# Altium footprint library altium_parts_templates_PCB.PcbLib: 93 footprints (part 1 of 6)
Each footprint in its own frame and in the unit in brackets; x right, y up, seen from the top. Pads: shape width x height; smd on the part's side, far side on the other; paste and mask are expansions set on the pad; w line width, h text height; cw(c..) or ccw(c..) is an arc to the next point about the centre after c.
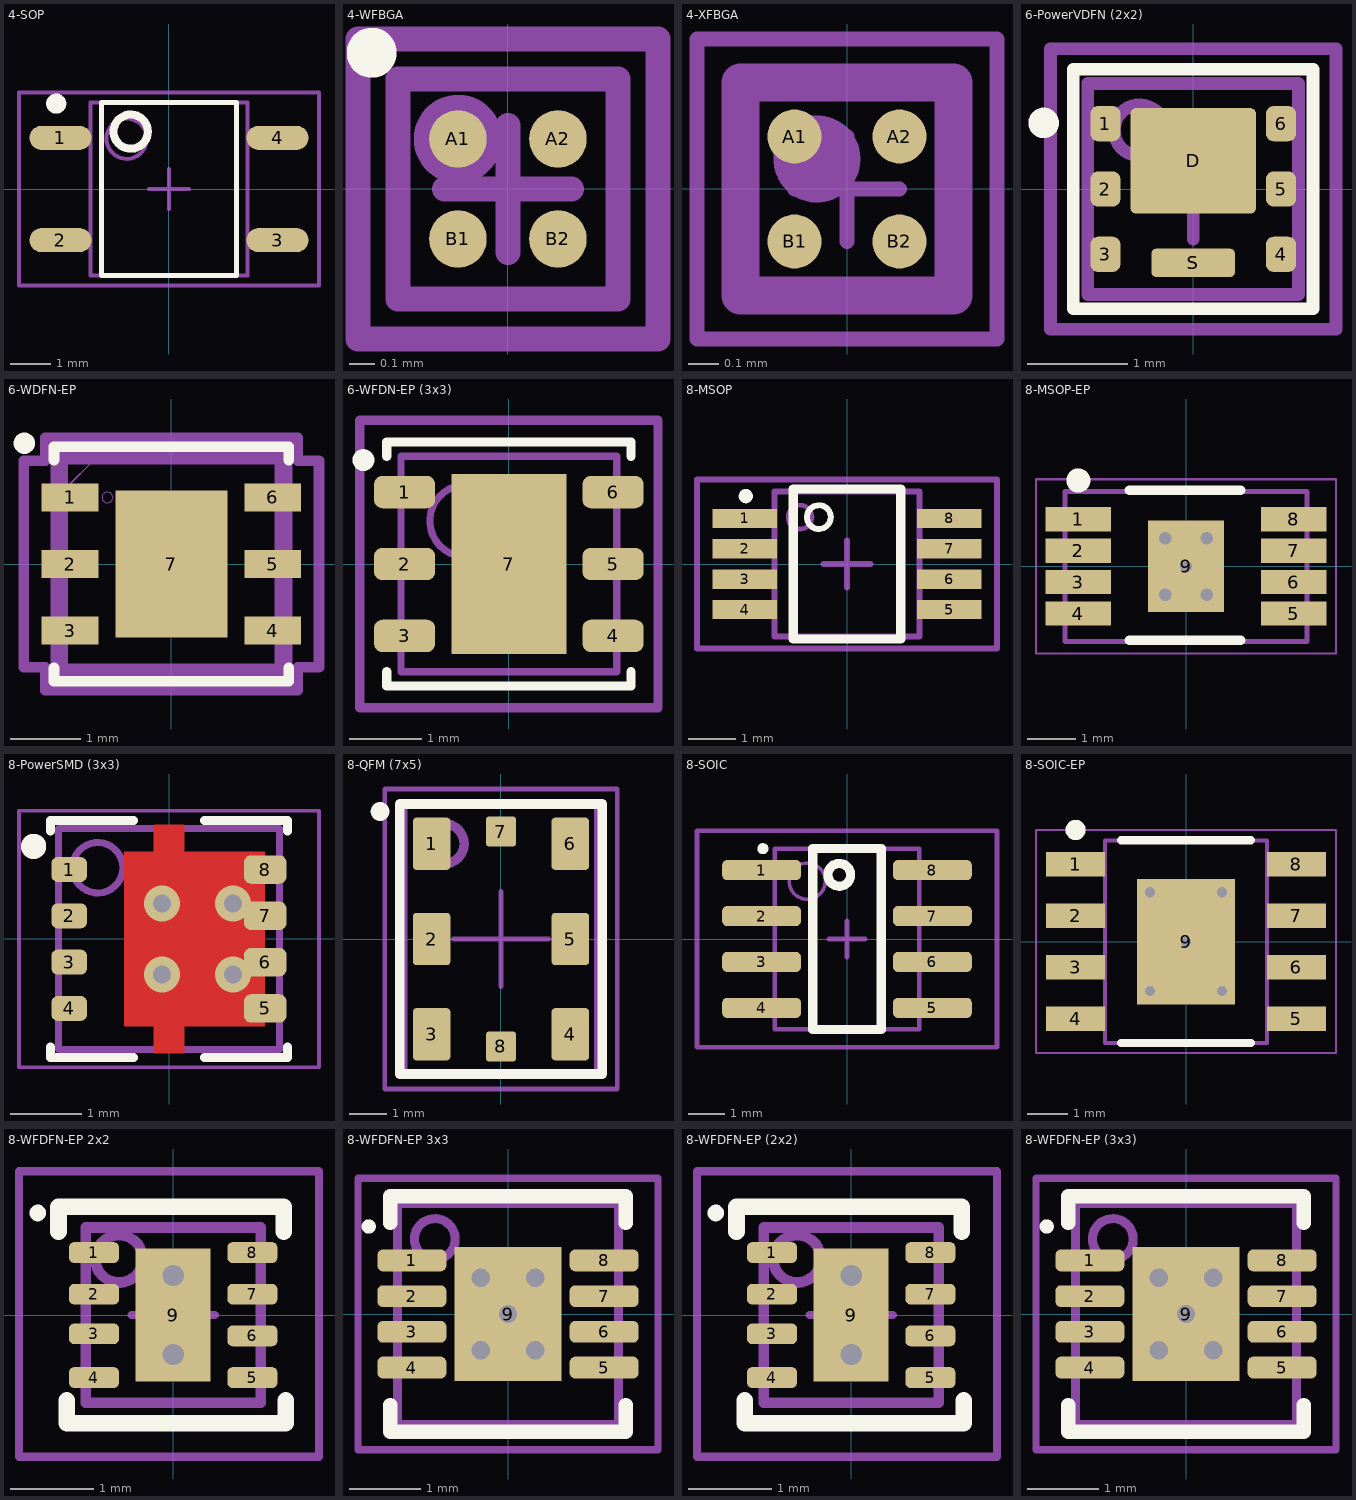
[diagram p0: the footprints below, top view; thin cyan lines are the x and y axes]

## 4-SOP [mm]
height 2.19
pads (4):
  oval 1.54x0.6 smd paste-0.025 mask+0.07: 1(-2.695,1.27) 2(-2.695,-1.27) 3(2.695,-1.27) 4(2.695,1.27)
Top Overlay:
  circle w0.25: c-2.8,2.12 r0.125
  circle w0.2: c-0.95,1.425 r0.425
  lines w0.127: -1.675,-2.15 -1.675,2.15 1.675,2.15 1.675,-2.15 -1.675,-2.15
Top Assembly Drawing:
  circle w0.1: c-1.05,1.25 r0.5
  lines w0.1: -1.95,-2.15 -1.95,2.15 1.95,2.15 1.95,-2.15 -1.95,-2.15
Top Courtyard:
  lines w0.1: -0.5,0 0.5,0 ; 0,-0.5 0,0.5 ; -3.725,-2.4 -3.725,2.4 3.725,2.4 3.725,-2.4 -3.725,-2.4
3D body "SOP254P610X218-4N.step": height 2.18, standoff 0, extent -3.049,-2.15 3.049,2.15

## 4-WFBGA [mm] "4-WFBGA, 4-DSBGA"
height 0.68
pads (4):
  round 0.23 smd paste+0 mask+0.04: A1(-0.2,0.2) A2(0.2,0.2) B1(-0.2,-0.2) B2(0.2,-0.2)
Top Overlay:
  circle w0.1: c-0.545,0.545 r0.05
Top Assembly Drawing:
  circle w0.254: c-0.2,0.2 r0.05
  lines w0.1: -0.44,-0.44 0.44,-0.44 0.44,0.44 -0.44,0.44 -0.44,-0.44
Top Courtyard:
  lines w0.1: -0.254,0 0.254,0 ; 0,-0.254 0,0.254 ; -0.6,-0.6 0.6,-0.6 0.6,0.6 -0.6,0.6 -0.6,-0.6
3D body "SEN_TEMP_LMT70YFQT.step": height 0.67, standoff 0, extent -0.44,-0.44 0.44,0.44

## 4-XFBGA [mm] "4-XFBGA, 4-DSBGA"
height 0.4
pads (4):
  round 0.18 smd paste-2 mask+0.038: A1(-0.175,0.175) A2(0.175,0.175) B1(-0.175,-0.175) B2(0.175,-0.175)
Top Paste:
  region: 0,-0.04
  region: -0.28,0.23 -0.28,0.24 -0.272,0.258 -0.258,0.272 -0.24,0.28 -0.23,0.28 -0.12,0.28 -0.11,0.28 -0.092,0.272 -0.078,0.258 -0.07,0.24 -0.07,0.23 -0.07,0.12 -0.07,0.11 -0.078,0.092 -0.092,0.078 -0.11,0.07 -0.12,0.07 -0.23,0.07 -0.24,0.07 -0.258,0.078 -0.272,0.092 -0.28,0.11 -0.28,0.12
  region: 0.07,0.23 0.07,0.24 0.078,0.258 0.092,0.272 0.11,0.28 0.12,0.28 0.23,0.28 0.24,0.28 0.258,0.272 0.272,0.258 0.28,0.24 0.28,0.23 0.28,0.12 0.28,0.11 0.272,0.092 0.258,0.078 0.24,0.07 0.23,0.07 0.12,0.07 0.11,0.07 0.092,0.078 0.078,0.092 0.07,0.11 0.07,0.12
  region: -0.28,-0.12 -0.28,-0.11 -0.272,-0.092 -0.258,-0.078 -0.24,-0.07 -0.23,-0.07 -0.12,-0.07 -0.11,-0.07 -0.092,-0.078 -0.078,-0.092 -0.07,-0.11 -0.07,-0.12 -0.07,-0.23 -0.07,-0.24 -0.078,-0.258 -0.092,-0.272 -0.11,-0.28 -0.12,-0.28 -0.23,-0.28 -0.24,-0.28 -0.258,-0.272 -0.272,-0.258 -0.28,-0.24 -0.28,-0.23
  region: 0.07,-0.12 0.07,-0.11 0.078,-0.092 0.092,-0.078 0.11,-0.07 0.12,-0.07 0.23,-0.07 0.24,-0.07 0.258,-0.078 0.272,-0.092 0.28,-0.11 0.28,-0.12 0.28,-0.23 0.28,-0.24 0.272,-0.258 0.258,-0.272 0.24,-0.28 0.23,-0.28 0.12,-0.28 0.11,-0.28 0.092,-0.272 0.078,-0.258 0.07,-0.24 0.07,-0.23
Top Assembly Drawing:
  circle w0.15: c-0.1,0.1 r0.07
  lines w0.127: -0.355,-0.355 -0.355,0.355 0.355,0.355 0.355,-0.355 -0.355,-0.355
Top Courtyard:
  lines w0.05: -0.175,0 0.175,0 ; 0,-0.175 0,0.175 ; -0.5,-0.5 -0.5,0.5 0.5,0.5 0.5,-0.5 -0.5,-0.5
3D body "BGA4C35P2X2_71X71X40.step": height 0.37, standoff -0.03, extent -0.355,-0.355 0.355,0.355

## 6-PowerVDFN (2x2) [mm] "6-PowerVDFN, 6-PQFN (2x2)"
height 1
pads (8):
  rrect50% 0.3x0.35 smd paste-0.01 mask+0.02: 1(-0.875,0.65) 2(-0.875,0) 3(-0.875,-0.65) 4(0.875,-0.65) 5(0.875,0) 6(0.875,0.65)
  rrect10% 1.25x1.05 smd paste-2 mask+0.02: D(0,0.28)
  rrect30% 0.83x0.28 smd paste-0.01 mask+0.02: S(0,-0.735)
Top Overlay:
  circle w0.152: c-1.49,0.658 r0.076
  lines w0.127: -1.194,-1.194 1.194,-1.194 1.194,1.194 -1.194,1.194 -1.194,-1.194
Top Paste:
  rectangle: -0.615,-0.235 -0.125,0.795
  region: 0.615,0.795 0.125,0.795 0.125,-0.235 0.615,-0.235
Top Assembly Drawing:
  circle w0.127: c-0.533,0.584 r0.254
  lines w0.127: -1.05,-1.05 -1.05,1.05 1.05,1.05 1.05,-1.05 -1.05,-1.05
Top Courtyard:
  lines w0.127: -0.5,0 0.5,0 ; 0,-0.5 0,0.5 ; -1.422,-1.397 -1.422,1.397 1.422,1.397 1.422,-1.397 -1.422,-1.397
3D body "QFN65P200X200X100_HS-7N.step": height 1, standoff 0, extent -1.051,-1.05 1.051,1.05

## 6-WDFN-EP [mil] "6-WSON (3x3), 6-WDFN-EP"
pads (7):
  rect 32x16 smd paste+0 mask+0: 1(-57,37.4) 2(-57,0) 3(-57,-37.4) 4(57,-37.4) 5(57,0) 6(57,37.4)
  rect 62.99x82.68 smd paste-40.84 mask+0: 7(0,0)
Top Overlay:
  circle w6: c-82.68,67.91 r3
  lines w6: -66,-58.5 -66,-66 66,-66 66,-58.5 ; -66,58.5 -66,66 66,66 66,58.5
Top Paste:
  region: 31.5,41.34 -31.5,41.34 -31.5,-41.34 31.5,-41.34
Top Assembly Drawing:
  lines w10: -62.99,-61.02 62.01,-61.02 62.99,-60.04 62.99,61.02 -62.99,61.02 -62.99,-61.02
Top 3D Model:
  circle w0: c-36,37.4 r3
  lines w1: -61,41 -41,61 ; -61,-61 -61,61 61,61 61,-61 -61,-61
Top Courtyard:
  lines w3.94: -9.84,0 9.84,0 ; 0,-9.84 0,9.84
  lines w6: -83,-58.1 -71,-58.1 -71,-71 71,-71 71,-58.1 83,-58.1 83,58.1 71,58.1 71,71 -71,71 -71,58.1 -83,58.1 -83,-58.1
3D body "SDE06A.stp": height 28.11, standoff 0, extent -62.99,-60.98 63,60.99

## 6-WFDN-EP (3x3) [mm] "6-WFDN-EP,  6-DFN (3x3)"
height 0.8
pads (7):
  rrect50% 0.85x0.45 smd paste+0 mask+0.064: 1(-1.45,1) 2(-1.45,0) 3(-1.45,-1) 4(1.45,-1) 5(1.45,0) 6(1.45,1)
  rect 1.6x2.5 smd paste-25.4 mask+0.064: 7(0,0)
Top Overlay:
  circle w0.152: c-2.023,1.446 r0.076
  lines w0.127: -1.7,-1.5 -1.7,-1.7 1.7,-1.7 1.7,-1.5 ; -1.7,1.5 -1.7,1.7 1.7,1.7 1.7,1.5
Top Paste:
  rectangle: -0.5,-1.15 0.5,-0.15
  rectangle: -0.5,0.15 0.5,1.15
Top Assembly Drawing:
  circle w0.1: c-0.6,0.6 r0.5
  lines w0.1: -1.5,-1.5 -1.5,1.5 1.5,1.5 1.5,-1.5 -1.5,-1.5
Top Courtyard:
  lines w0.127: -0.5,0 0.5,0 ; 0,-0.5 0,0.5 ; -2.075,-2 2.075,-2 2.075,2 -2.075,2 -2.075,-2
3D body "SEN_TEMP_SI7051-A20-IM.step": height 0.8, standoff 0, extent -1.501,-1.5 1.501,1.5

## 8-MSOP [mil] "8-MSOP, 8-uMAX, 8-TSSOP"
height 43.31
pads (8):
  rect 54x16 smd paste-0.98 mask+1.97: 1(-86,38.39) 2(-86,12.8) 3(-86,-12.8) 4(-86,-38.39) 5(86,-38.39) 6(86,-12.8) 7(86,12.8) 8(86,38.39)
Top Overlay:
  circle w5: c-23.62,39.37 r10
  circle w6: c-85,57 r3
  lines w7.87: -45.28,-62.99 -45.28,62.99 45.28,62.99 45.28,-62.99 -45.28,-62.99
Top Assembly Drawing:
  circle w3.94: c-39.37,39.37 r10.04
  lines w5: -61.02,-61.02 61.02,-61.02 61.02,61.02 -61.02,61.02 -61.02,-61.02
Top Courtyard:
  lines w5: -19.69,0 19.68,0 ; 0,-19.69 0,19.68 ; -125.98,-70.87 -125.98,70.87 125.98,70.87 125.98,-70.87 -125.98,-70.87
3D body "ADC_MAX11647.step": height 43.31, standoff 0, extent -96.55,-61.02 96.56,61.03

## 8-MSOP-EP [mm] "8-MSOP-EP"
height 1.1
pads (9):
  rect 1.35x0.5 smd paste-0.076: 1(-2.225,0.975) 2(-2.225,0.325) 3(-2.225,-0.325) 4(-2.225,-0.975) 5(2.225,-0.975) 6(2.225,-0.325) 7(2.225,0.325) 8(2.225,0.975)
  rect 1.57x1.89 smd: 9(0,0)
via 0,0 diameter 0.508 hole 0.254
via -0.432,-0.584 diameter 0.508 hole 0.254
via 0.432,-0.584 diameter 0.508 hole 0.254
via 0.432,0.584 diameter 0.508 hole 0.254
via -0.432,0.584 diameter 0.508 hole 0.254
Top Overlay:
  circle w0.25: c-2.225,1.775 r0.125
  lines w0.2: -1.175,-1.525 1.125,-1.525 ; -1.175,1.575 1.125,1.575
Top 3D Model:
  lines w0.1: -2.5,-1.55 -2.5,1.55 2.5,1.55 2.5,-1.55 -2.5,-1.55
Top Courtyard:
  lines w0.05: -3.1,-1.8 -3.1,1.8 3.1,1.8 3.1,-1.8 -3.1,-1.8
  lines w0.1: -0.5,0 0.5,0 ; 0,-0.5 0,0.5
3D body "MSOP-8.step": height 0.92, standoff 0, extent -2.5,-1.5 2.5,1.5

## 8-PowerSMD (3x3) [mm] "8-DFN (3x3)"
height 0.9
pads (8):
  rrect50% 0.5x0.35 smd paste-0.025 mask+0.07: 1(-1.4,0.975) 2(-1.4,0.325) 3(-1.4,-0.325) 4(-1.4,-0.975)
  rrect50% 0.6x0.4 smd paste-0.7 mask+0.07: 5(1.35,-0.975) 6(1.35,-0.325) 7(1.35,0.325) 8(1.35,0.975)
via -0.1,-0.5 diameter 0.508 hole 0.254
via 0.9,-0.5 diameter 0.508 hole 0.254
via 0.9,0.5 diameter 0.508 hole 0.254
via -0.1,0.5 diameter 0.508 hole 0.254
Top Layer:
  rectangle: -0.215,-1.605 0.215,1.605
  rectangle: -0.63,-1.225 1.35,1.225
Top Overlay:
  circle w0.254: c-1.9,1.3 r0.05
  lines w0.127: -1.663,-1.513 -1.663,-1.663 -0.5,-1.663 ; -1.663,1.513 -1.663,1.663 -0.5,1.663 ; 0.5,-1.663 1.663,-1.663 1.663,-1.513 ; 0.5,1.663 1.663,1.663 1.663,1.513
Top Paste:
  region: 1.575,0.825 1.275,0.825 1.275,0.475 1.575,0.475 1.575,0.175 -0.538,0.175 -0.538,1.125 -0.157,1.125 -0.157,1.55 0.15,1.55 0.15,1.125 1.575,1.125
  region: -0.371,1.175
  region: 1.575,-0.825 1.275,-0.825 1.275,-0.475 1.575,-0.475 1.575,-0.175 -0.538,-0.175 -0.538,-1.125 -0.157,-1.125 -0.157,-1.55 0.15,-1.55 0.15,-1.125 1.575,-1.125
Top Assembly Drawing:
  circle w0.1: c-1,1 r0.354
  lines w0.1: -1.55,-1.55 1.55,-1.55 1.55,1.55 -1.55,1.55 -1.55,-1.55
Top Courtyard:
  lines w0.05: -2.105,-1.8 2.105,-1.8 2.105,1.8 -2.105,1.8 -2.105,-1.8
  lines w0.1: -0.5,0 0.5,0 ; 0,-0.5 0,0.5
3D body "SON65P300X90-8N.step": height 0.9, standoff 0, extent -1.551,-1.55 1.551,1.55

## 8-QFM (7x5) [mm]
height 1.15
pads (8):
  rrect20% 1x1.4 smd paste-10 mask+0.07: 1(-1.85,2.54) 2(-1.85,0) 3(-1.85,-2.54) 4(1.85,-2.54) 5(1.85,0) 6(1.85,2.54)
  rrect20% 0.8x0.8 smd paste+0 mask+0.07: 7(0,2.865) 8(0,-2.865)
Top Overlay:
  circle w0.25: c-3.225,3.4 r0.125
  lines w0.254: -2.7,-3.6 2.7,-3.6 2.7,3.6 -2.7,3.6 -2.7,-3.6
Top Paste:
  drawing of 25 lines, arcs and shapes, not listed
Top Assembly Drawing:
  circle w0.254: c-1.524,2.54 r0.539
  lines w0.127: -2.55,-3.55 2.55,-3.55 2.55,3.55 -2.55,3.55 -2.55,-3.55
Top Courtyard:
  lines w0.127: -1.27,0 1.27,0 ; 0,-1.27 0,1.27 ; -3.1,-4 3.1,-4 3.1,4 -3.1,4 -3.1,-4
3D body: height 1.15, standoff 0, extent -2.55,-3.55 2.55,3.55

## 8-SOIC [mil] "8-SOIC"
height 68.9
pads (8):
  rrect50% 86x22 smd paste-0.98 mask+2.76: 1(-93,75) 2(-93,25) 3(-93,-25) 4(-93,-75) 5(93,-75) 6(93,-25) 7(93,25) 8(93,75)
Top Overlay:
  circle w6: c-91.65,98.34 r3
  lines w10: 3.91,70.72 ccw(c-8.42,69.86) 3.94,69.88 ; -37.4,-98.43 37.4,-98.43 37.4,98.43 -37.4,98.43 -37.4,-98.43
Top Assembly Drawing:
  circle w3.94: c-43.31,62.99 r19.68
  lines w5: -78.74,-98.43 78.74,-98.43 78.74,98.43 -78.74,98.43 -78.74,-98.43
Top Courtyard:
  lines w5: -19.69,0 19.68,0 ; 0,-19.68 0,19.68 ; -163.39,-118.11 163.39,-118.11 163.39,118.11 -163.39,118.11 -163.39,-118.11
3D body "COM_BUF_P82B715D.step": height 68.9, standoff 0, extent -118.11,-98.43 118.11,98.43

## 8-SOIC-EP [mm] "8-SOIC-EP"
height 1.75
pads (9):
  rect 1.45x0.6 smd: 1(-2.725,1.905) 2(-2.725,0.635) 3(-2.725,-0.635) 4(-2.725,-1.905) 5(2.725,-1.905) 6(2.725,-0.635) 7(2.725,0.635) 8(2.725,1.905)
  rect 2.41x3.1 smd: 9(0,0)
via -0.889,1.219 diameter 0.508 hole 0.254
via 0.889,1.219 diameter 0.508 hole 0.254
via -0.889,-1.219 diameter 0.508 hole 0.254
via 0.889,-1.219 diameter 0.508 hole 0.254
via 0,0 diameter 0.508 hole 0.254
Top Overlay:
  circle w0.25: c-2.725,2.755 r0.125
  lines w0.2: -1.6,-2.5 1.6,-2.5 ; -1.6,2.5 1.6,2.5
Top 3D Model:
  lines w0.1: -2,-2.5 2,-2.5 2,2.5 -2,2.5 -2,-2.5
Top Courtyard:
  lines w0.05: -3.7,-2.75 3.7,-2.75 3.7,2.75 -3.7,2.75 -3.7,-2.75
  lines w0.1: -0.5,0 0.5,0 ; 0,-0.5 0,0.5
3D body "SOIC-8-EP.stp": height 1.65, standoff 0, extent -3.099,-2.502 3.099,2.502

## 8-WFDFN-EP 2x2 [mm] "8-WFDFN-EP, 8-LFCSP-WD (3x3),  8-WSON (2x2)"
height 0.8
pads (9):
  rrect50% 0.6x0.25 smd paste-0.025 mask+0.05: 1(-0.95,0.75) 2(-0.95,0.25) 3(-0.95,-0.225) 4(-0.95,-0.75) 5(0.95,-0.75) 6(0.95,-0.25) 7(0.95,0.25) 8(0.95,0.75)
  rect 0.9x1.6 smd mask+0: 9(0,0)
via 0,-0.475 diameter 0.508 hole 0.254
via 0,0.475 diameter 0.508 hole 0.254
Top Overlay:
  circle w0.1: c-1.625,1.225 r0.05
  lines w0.2: -1.375,1 -1.375,1.3 1.325,1.3 1.325,1 ; -1.275,-1.025 -1.275,-1.3 1.35,-1.3 1.35,-1.025
Top Assembly Drawing:
  circle w0.127: c-0.65,0.675 r0.285
  lines w0.127: -1.05,-1.05 1.05,-1.05 1.05,1.05 -1.05,1.05 -1.05,-1.05
Top Courtyard:
  lines w0.1: -0.5,0 0.5,0 ; 0,-0.5 0,0.5 ; -1.85,-1.7 -1.85,1.725 1.75,1.725 1.75,-1.7 -1.85,-1.7
3D body "DSG8_1P6X0P9.stp": height 0.8, standoff 0, extent -1.05,-1.05 1.05,1.05

## 8-WFDFN-EP 3x3 [mil] "8-WFDFN-EP, 8-LFCSP-WD (3x3),  8-WSON (3x3)"
height 31.5
pads (9):
  rrect50% 38x12 smd paste-0.98 mask+1.97: 1(-53,29.53) 2(-53,9.84) 3(-53,-9.84) 4(-53,-29.53) 5(53,-29.53) 6(53,-9.84) 7(53,9.84) 8(53,29.53)
  rect 59.06x74 smd mask+0: 9(0,0)
via -15,-20 diameter 20 hole 10
via 15,-20 diameter 20 hole 10
via 15,20 diameter 20 hole 10
via -15,20 diameter 20 hole 10
via 0,0 diameter 20 hole 10
Top Overlay:
  circle w3.94: c-76.77,48.23 r1.97
  lines w7.87: -64.96,-50.2 -64.96,-64.96 64.96,-64.96 64.96,-50.2 ; -64.96,50.2 -64.96,64.96 64.96,64.96 64.96,50.2
Top Assembly Drawing:
  circle w5: c-40.35,41.34 r11.22
  lines w5: -61.02,-61.02 61.02,-61.02 61.02,61.02 -61.02,61.02 -61.02,-61.02
Top Courtyard:
  lines w3.94: -19.69,0 19.68,0 ; 0,-19.68 0,19.69 ; -82.68,-74.8 -82.68,74.8 82.68,74.8 82.68,-74.8 -82.68,-74.8
3D body: height 31.5, standoff 0.79, extent -59.06,-59.06 59.06,59.06

## 8-WFDFN-EP (2x2) [mm] "8-WFDFN-EP, 8-LFCSP-WD (3x3),  8-WSON (2x2)"
height 0.8
pads (9):
  rrect50% 0.6x0.25 smd paste-0.025 mask+0.05: 1(-0.95,0.75) 2(-0.95,0.25) 3(-0.95,-0.225) 4(-0.95,-0.75) 5(0.95,-0.75) 6(0.95,-0.25) 7(0.95,0.25) 8(0.95,0.75)
  rect 0.9x1.6 smd mask+0: 9(0,0)
via 0,-0.475 diameter 0.508 hole 0.254
via 0,0.475 diameter 0.508 hole 0.254
Top Overlay:
  circle w0.1: c-1.625,1.225 r0.05
  lines w0.2: -1.375,1 -1.375,1.3 1.325,1.3 1.325,1 ; -1.275,-1.025 -1.275,-1.3 1.35,-1.3 1.35,-1.025
Top Assembly Drawing:
  circle w0.127: c-0.65,0.675 r0.285
  lines w0.127: -1.05,-1.05 1.05,-1.05 1.05,1.05 -1.05,1.05 -1.05,-1.05
Top Courtyard:
  lines w0.1: -0.5,0 0.5,0 ; 0,-0.5 0,0.5 ; -1.85,-1.7 -1.85,1.725 1.75,1.725 1.75,-1.7 -1.85,-1.7
3D body "DSG8_1P6X0P9.stp": height 0.8, standoff 0, extent -1.05,-1.05 1.05,1.05

## 8-WFDFN-EP (3x3) [mil] "8-WFDFN-EP, 8-LFCSP-WD (3x3),  8-WSON (3x3)"
height 31.5
pads (9):
  rrect50% 38x12 smd paste-0.98 mask+1.97: 1(-53,29.53) 2(-53,9.84) 3(-53,-9.84) 4(-53,-29.53) 5(53,-29.53) 6(53,-9.84) 7(53,9.84) 8(53,29.53)
  rect 59.06x74 smd mask+0: 9(0,0)
via 0,0 diameter 20 hole 10
via -15,20 diameter 20 hole 10
via 15,20 diameter 20 hole 10
via 15,-20 diameter 20 hole 10
via -15,-20 diameter 20 hole 10
Top Overlay:
  circle w3.94: c-76.77,48.23 r1.97
  lines w7.87: -64.96,-50.2 -64.96,-64.96 64.96,-64.96 64.96,-50.2 ; -64.96,50.2 -64.96,64.96 64.96,64.96 64.96,50.2
Top Assembly Drawing:
  circle w5: c-40.35,41.34 r11.22
  lines w5: -61.02,-61.02 -61.02,61.02 61.02,61.02 61.02,-61.02 -61.02,-61.02
Top Courtyard:
  lines w3.94: -19.69,0 19.68,0 ; 0,-19.68 0,19.69 ; -82.68,-74.8 82.68,-74.8 82.68,74.8 -82.68,74.8 -82.68,-74.8
3D body: height 31.5, standoff 0.79, extent -59.06,-59.06 59.06,59.06